# Altium footprint library Connectors.PcbLib: 135 footprints (part 3 of 9)
Each footprint in its own frame and in the unit in brackets; x right, y up, seen from the top. Pads: shape width x height; smd on the part's side, far side on the other; paste and mask are expansions set on the pad; w line width, h text height; cw(c..) or ccw(c..) is an arc to the next point about the centre after c.
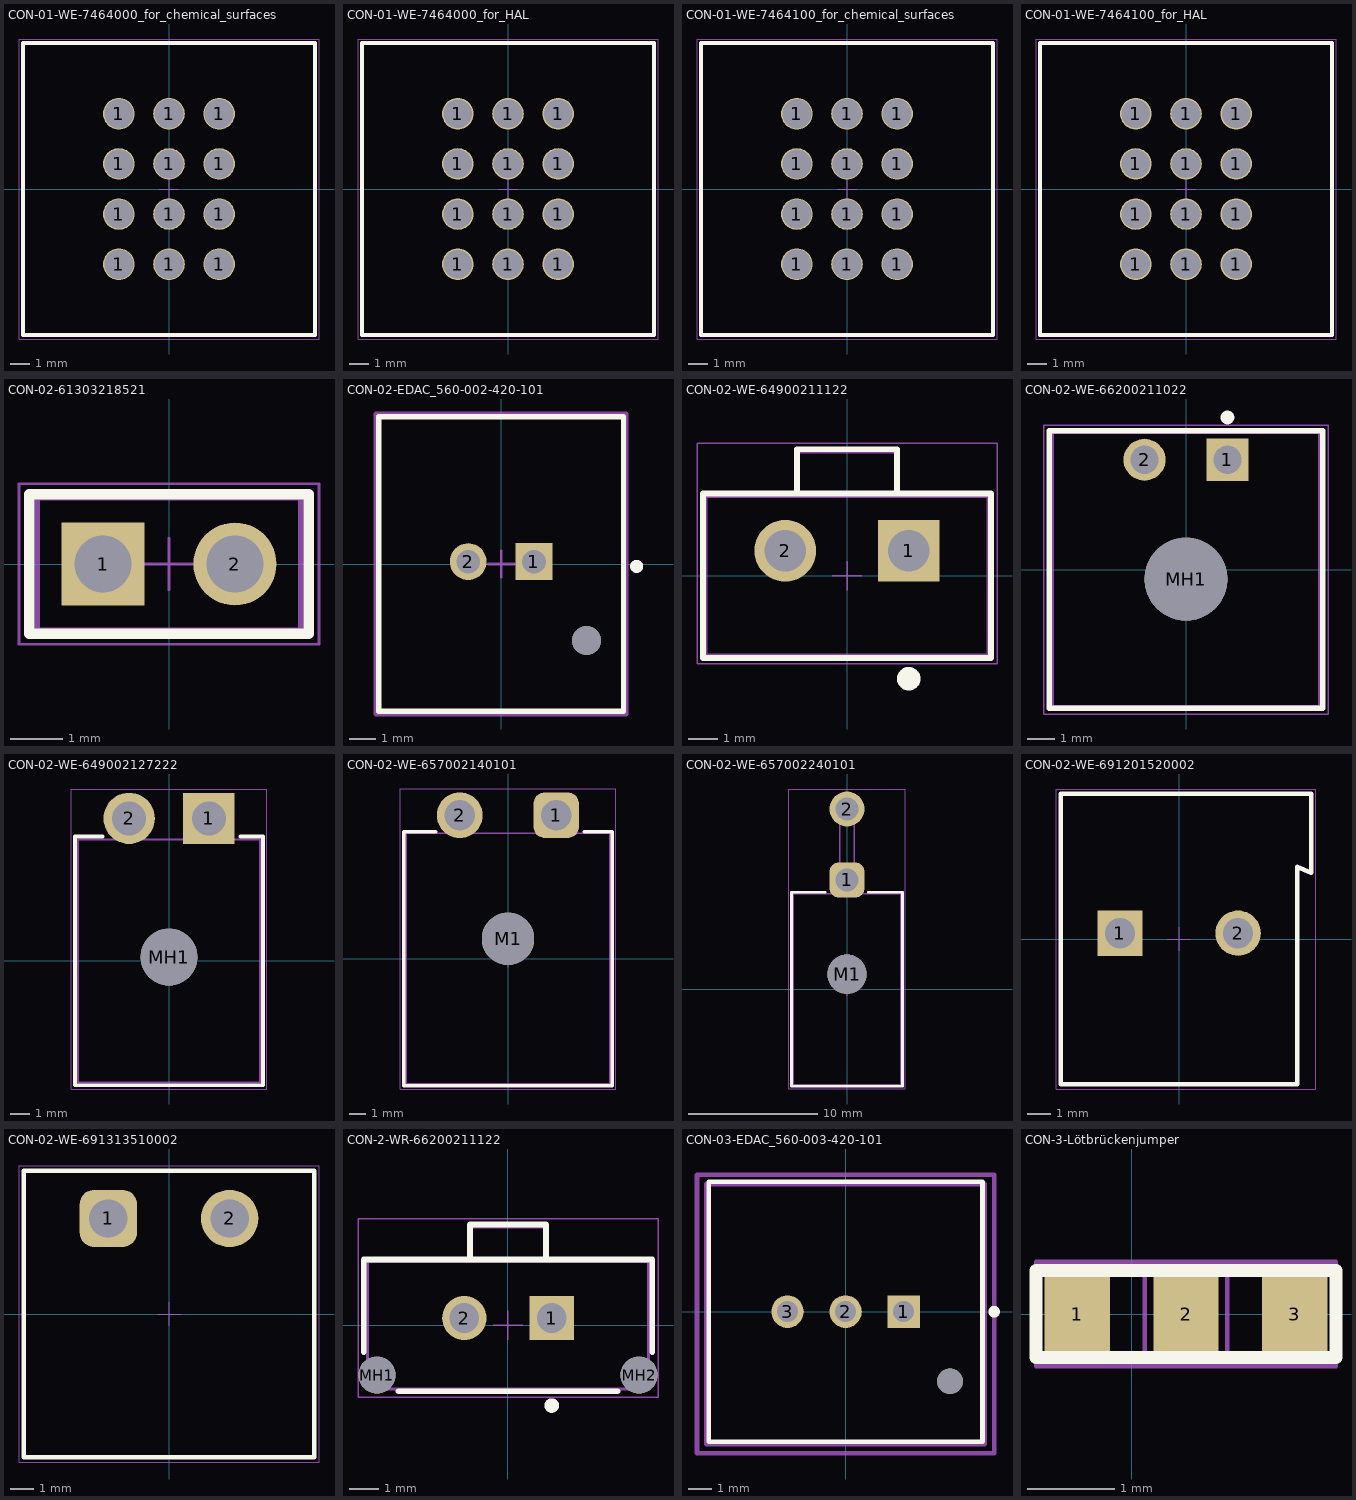
[diagram p2: the footprints below, top view; thin cyan lines are the x and y axes]

## CON-01-WE-7464000_for_chemical_surfaces [mm] "Direct Plug Terminal, 12pins"
height 18.1
pads (12):
  round 1.6 hole 1.475: 1(-2.54,-3.81) 1(-2.54,-1.27) 1(-2.54,1.27) 1(-2.54,3.81) 1(0,-3.81) 1(0,-1.27) 1(0,1.27) 1(0,3.81) 1(2.54,-3.81) 1(2.54,-1.27) 1(2.54,1.27) 1(2.54,3.81)
Top Overlay:
  lines w0.2: -7.4,-7.4 -7.4,7.4 7.4,7.4 7.4,-7.4 -7.4,-7.4
Top Component Center:
  lines w0.05: -0.5,0 0.5,0 ; 0,-0.5 0,0.5
Top Component Outline:
  lines w0.1: -7.4,-7.4 -7.4,7.4 7.4,7.4 7.4,-7.4 -7.4,-7.4
Top Courtyard (Mech26):
  lines w0.05: -7.6,-7.6 -7.6,7.6 7.6,7.6 7.6,-7.6 -7.6,-7.6
3D body "7464000 (rev1).stp": height 18.1, standoff -3.5, extent -7.385,-7.385 7.385,7.385

## CON-01-WE-7464000_for_HAL [mm] "Direct Plug Terminal, 12pins"
height 18.1
pads (12):
  round 1.6 hole 1.45: 1(-2.54,-3.81) 1(-2.54,-1.27) 1(-2.54,1.27) 1(-2.54,3.81) 1(0,-3.81) 1(0,-1.27) 1(0,1.27) 1(0,3.81) 1(2.54,-3.81) 1(2.54,-1.27) 1(2.54,1.27) 1(2.54,3.81)
Top Overlay:
  lines w0.2: -7.4,-7.4 -7.4,7.4 7.4,7.4 7.4,-7.4 -7.4,-7.4
Top Component Center:
  lines w0.05: -0.5,0 0.5,0 ; 0,-0.5 0,0.5
Top Component Outline:
  lines w0.1: -7.4,-7.4 -7.4,7.4 7.4,7.4 7.4,-7.4 -7.4,-7.4
Top Courtyard (Mech26):
  lines w0.05: -7.6,-7.6 -7.6,7.6 7.6,7.6 7.6,-7.6 -7.6,-7.6
3D body "7464000 (rev1).stp": height 18.1, standoff -3.5, extent -7.385,-7.385 7.385,7.385

## CON-01-WE-7464100_for_chemical_surfaces [mm] "Direct Plug Terminal, 12pins"
height 18.1
pads (12):
  round 1.6 hole 1.475: 1(-2.54,-3.81) 1(-2.54,-1.27) 1(-2.54,1.27) 1(-2.54,3.81) 1(0,-3.81) 1(0,-1.27) 1(0,1.27) 1(0,3.81) 1(2.54,-3.81) 1(2.54,-1.27) 1(2.54,1.27) 1(2.54,3.81)
Top Overlay:
  lines w0.2: -7.4,-7.4 7.4,-7.4 7.4,7.4 -7.4,7.4 -7.4,-7.4
Top Component Center:
  lines w0.05: -0.5,0 0.5,0 ; 0,-0.5 0,0.5
Top Component Outline:
  lines w0.1: -7.4,-7.4 7.4,-7.4 7.4,7.4 -7.4,7.4 -7.4,-7.4
Top Courtyard (Mech26):
  lines w0.05: -7.6,-7.6 7.6,-7.6 7.6,7.6 -7.6,7.6 -7.6,-7.6
3D body "7464000 (rev1).stp": height 18.1, standoff -3.5, extent -7.385,-7.385 7.385,7.385

## CON-01-WE-7464100_for_HAL [mm] "Direct Plug Terminal, 12pins"
height 18.1
pads (12):
  round 1.6 hole 1.45: 1(-2.54,-3.81) 1(-2.54,-1.27) 1(-2.54,1.27) 1(-2.54,3.81) 1(0,-3.81) 1(0,-1.27) 1(0,1.27) 1(0,3.81) 1(2.54,-3.81) 1(2.54,-1.27) 1(2.54,1.27) 1(2.54,3.81)
Top Overlay:
  lines w0.2: -7.4,-7.4 7.4,-7.4 7.4,7.4 -7.4,7.4 -7.4,-7.4
Top Component Center:
  lines w0.05: -0.5,0 0.5,0 ; 0,-0.5 0,0.5
Top Component Outline:
  lines w0.1: -7.4,-7.4 7.4,-7.4 7.4,7.4 -7.4,7.4 -7.4,-7.4
Top Courtyard (Mech26):
  lines w0.05: -7.6,-7.6 -7.6,7.6 7.6,7.6 7.6,-7.6 -7.6,-7.6
3D body "7464000 (rev1).stp": height 18.1, standoff -3.5, extent -7.385,-7.385 7.385,7.385

## CON-02-61303218521 [mm] "Pin Header, pitch 2.54 mm, THT, Vertical, single row, 2p"
height 36.48
pads (2):
  rect 1.6x1.6 hole 1.1: 1(-1.27,0)
  round 1.6 hole 1.1: 2(1.27,0)
Top Overlay:
  lines w0.2: -2.69,-1.345 2.69,-1.345 2.69,1.345 -2.69,1.345 -2.69,-1.345
Top Component Center:
  lines w0.05: -0.5,0 0.5,0 ; 0,-0.5 0,0.5
Top Component Outline:
  lines w0.1: -2.54,-1.27 2.54,-1.27 2.54,1.27 -2.54,1.27 -2.54,-1.27
Top Courtyard (Mech26):
  lines w0.05: -2.89,-1.545 2.89,-1.545 2.89,1.545 -2.89,1.545 -2.89,-1.545
3D body "61303218521_2pin_simple.stp": height 36.48, standoff -3, extent -2.54,-1.27 2.54,1.27

## CON-02-EDAC_560-002-420-101 [mm] "EDAC 560 SERIES WATERPROOF CONNECTOR 2 Pin"
height 15.5
pads (3):
  rect 1.4x1.4 hole 0.9 paste-2539.97 mask+0: 1(1.25,0.09)
  round 1.4 hole 0.9 paste-2539.97 mask+0: 2(-1.25,0.09)
  round 1.1 hole 1.1 unplated paste-2539.97 mask+0: ""(3.25,-2.91)
Top Overlay:
  circle w0.25: c5.15,-0.09 r0.125
  lines w0.2: -4.65,-5.6 4.65,-5.6 4.65,5.6 -4.65,5.6 -4.65,-5.6
Top Component Center:
  lines w0.1: -0.5,0 0.5,0 ; 0,-0.5 0,0.5
Top Component Outline:
  lines w0.15: -4.65,-5.6 -4.65,5.6 4.65,5.6 4.65,-5.6 -4.65,-5.6
Top Courtyard (Mech26):
  lines w0.2: -4.75,-5.7 -4.75,5.7 4.75,5.7 4.75,-5.7 -4.75,-5.7
Top Designator:
  text ".Designator" at 0,0 h1
3D body "Conn_EDAC_560-002-420-101_eec.STEP": height 15.5, standoff -3.55, extent -4.644,-5.597 4.656,5.553

## CON-02-WE-64900211122 [mm] "4.20mm Male Single Row Vertical Header, 2p"
height 12.8
pads (2):
  rect 2.1x2.1 hole 1.4: 1(2.1,0.85)
  round 2.1 hole 1.4: 2(-2.1,0.85)
Top Overlay:
  circle w0.4: c2.1,-3.5 r0.2
  lines w0.2: -1.7,2.8 -1.7,4.3 1.7,4.3 1.7,2.8 ; -4.9,-2.8 4.9,-2.8 4.9,2.8 -4.9,2.8 -4.9,-2.8
Top Component Center:
  lines w0.05: -0.5,0 0.5,0 ; 0,-0.5 0,0.5
Top Component Outline:
  lines w0.1: -1.7,2.7 -1.7,4.2 1.7,4.2 1.7,2.7 ; -4.8,-2.7 -4.8,2.7 4.8,2.7 4.8,-2.7 -4.8,-2.7
Top Courtyard (Mech26):
  lines w0.05: -5.1,-3 -5.1,4.5 5.1,4.5 5.1,-3 -5.1,-3
3D body "64900211122.stp": height 12.83, standoff -3.47, extent -4.8,-2.7 4.8,4.2

## CON-02-WE-66200211022 [mm] "3.00mm Male Single Row Angled Header with Plastic Pegs, 2p"
height 5.07
pads (3):
  rect 1.52x1.52 hole 1.02: 1(1.5,3.97)
  round 1.52 hole 1.02: 2(-1.5,3.97)
  round 3 hole 3 unplated: MH1(0,-0.35)
Top Overlay:
  circle w0.25: c1.5,5.5 r0.125
  lines w0.2: -4.95,-5.025 4.95,-5.025 4.95,5.025 -4.95,5.025 -4.95,-5.025
Top Component Center:
  lines w0.05: -0.5,0 0.5,0 ; 0,-0.5 0,0.5
Top Component Outline:
  lines w0.1: -4.825,-4.95 4.825,-4.95 4.825,4.95 -4.825,4.95 -4.825,-4.95
Top Courtyard (Mech26):
  lines w0.05: -5.15,-5.225 5.15,-5.225 5.15,5.225 -5.15,5.225 -5.15,-5.225
3D body "66200211022.stp": height 5.6, standoff -3.16, extent -4.825,-4.95 4.825,4.95

## CON-02-WE-649002127222 [mm] "4.20mm Male Single Row Angled Header with Mounting Pegs, 2p"
height 5.8
pads (3):
  rect 2.7x2.7 hole 1.8: 1(2.1,7.5)
  round 2.7 hole 1.8: 2(-2.1,7.5)
  round 3 hole 3 unplated: MH1(0,0.2)
Top Overlay:
  lines w0.2: -3.5,6.55 -4.95,6.55 -4.95,-6.55 4.95,-6.55 4.95,6.55 3.75,6.55
Top Component Center:
  lines w0.05: -0.5,0 0.5,0 ; 0,-0.5 0,0.5
Top Component Outline:
  lines w0.1: -4.8,-6.4 -4.8,6.4 4.8,6.4 4.8,-6.4 -4.8,-6.4
Top Courtyard (Mech26):
  lines w0.05: -5.15,-6.75 5.15,-6.75 5.15,9.05 -5.15,9.05 -5.15,-6.75
3D body "649002127222.stp": height 7.23, standoff -3.47, extent -4.8,-6.4 4.8,8.05

## CON-02-WE-657002140101 [mm] "WR-MPC5 THT Single Row Male Header Right Angled, 02p"
height 7.25
pads (3):
  rrect50% 2.7x2.7 hole 1.8: 1(2.85,8.47)
  round 2.7 hole 1.8: 2(-2.85,8.47)
  round 3.1 hole 3.1 unplated: M1(0,1.17)
Top Overlay:
  lines w0.2: -4.25,7.5 -6.15,7.5 -6.15,-7.5 6.15,-7.5 6.15,7.5 4.5,7.5
Top Component Center:
  lines w0.05: -0.5,0 0.5,0 ; 0,-0.5 0,0.5
Top Component Outline:
  lines w0.1: -3.42,7.4 -3.42,9.04 -2.28,9.04 -2.28,7.4 ; 2.28,7.4 2.28,9.04 3.42,9.04 3.42,7.4 ; -6.025,-7.4 -6.025,7.4 6.025,7.4 6.025,-7.4 -6.025,-7.4
Top Courtyard (Mech26):
  lines w0.05: -6.35,-7.7 6.35,-7.7 6.35,10.02 -6.35,10.02 -6.35,-7.7
Top Designator:
  text ".Designator" at -7.498,-0.5 h1.5
3D body "657002140101.stp": height 8.85, standoff -3.43, extent -6.025,-7.4 6.025,9.04

## CON-02-WE-657002240101 [mm] "WR-MPC5 Dual Row Male Header Right Angled, GW, THT, 02p"
height 14.53
pads (3):
  rrect50% 2.7x2.7 hole 1.8: 1(0,8.47)
  round 2.7 hole 1.8: 2(0,13.97)
  round 3.05 hole 3.05 unplated: M1(0,1.17)
Top Overlay:
  lines w0.2: -1.675,7.525 -4.3,7.525 -4.3,-7.525 4.3,-7.525 4.3,7.525 1.65,7.525
Top Component Center:
  lines w0.05: -0.5,0 0.5,0 ; 0,-0.5 0,0.5
Top Component Outline:
  lines w0.1: -0.57,7.4 -0.57,14.54 0.57,14.54 0.57,7.4 ; -0.57,9.04 0.57,9.04 ; -4.175,-7.4 -4.175,7.4 4.175,7.4 4.175,-7.4 -4.175,-7.4
Top Courtyard (Mech26):
  lines w0.05: -4.5,-7.725 4.5,-7.725 4.5,15.52 -4.5,15.52 -4.5,-7.725
Top Designator:
  text ".Designator" at -7.498,-0.5 h1.5
3D body "657002240101.stp": height 14.69, standoff -3.44, extent -4.175,-7.38 4.175,14.56

## CON-02-WE-691201520002 [mm] "Serie 2015 - 5.08 mm _ 2 pins"
height 12
pads (2):
  rect 1.95x1.95 hole 1.3: 1(-2.54,0.25)
  round 1.95 hole 1.3: 2(2.54,0.25)
Top Overlay:
  lines w0.2: -5.08,-6.25 -5.08,6.25 5.68,6.25 5.68,2.85 5.08,3.1 5.08,-6.25 -5.08,-6.25
Top Component Center:
  lines w0.05: -0.5,0 0.5,0 ; 0,-0.5 0,0.5
Top Component Outline:
  lines w0.1: -5.08,-6.25 5.08,-6.25 5.08,3.1 5.68,2.85 5.68,6.25 -5.08,6.25 -5.08,-6.25
Top Courtyard (Mech26):
  lines w0.05: -5.28,-6.45 -5.28,6.45 5.88,6.45 5.88,-6.45 -5.28,-6.45
3D body "691201520002.stp": height 12.1, standoff -4.4, extent -5.08,-6.25 5.68,6.25

## CON-02-WE-691313510002 [mm] "5,08mm - PCB Headers - Horizontal - Closed ends - 02p"
height 8.5
pads (2):
  rrect50% 2.4x2.4 hole 1.6: 1(-2.54,4)
  round 2.4 hole 1.6: 2(2.54,4)
Top Overlay:
  lines w0.2: -6.08,-6 -6.08,6 6.08,6 6.08,-6 -6.08,-6
Top Component Center:
  lines w0.05: -0.5,0 0.5,0 ; 0,-0.5 0,0.5
Top Component Outline:
  lines w0.1: -6.08,-6 -6.08,6 6.08,6 6.08,-6 -6.08,-6
Top Courtyard (Mech26):
  lines w0.05: -6.28,-6.2 6.28,-6.2 6.28,6.2 -6.28,6.2 -6.28,-6.2
Top Designator:
  text ".Designator" at -7.498,-0.5 h1.5
3D body "691313510002.stp": height 8.55, standoff -3.45, extent -6.08,-6 6.08,6

## CON-2-WR-66200211122 [mm] "3.00mm Male Single Row Vertical Header, 2p"
height 11
pads (4):
  rect 1.52x1.52 hole 1.02: 1(1.5,0.255)
  round 1.52 hole 1.02: 2(-1.5,0.255)
  round 1.27 hole 1.27 unplated: MH1(-4.5,-1.705) MH2(4.5,-1.705)
Top Overlay:
  circle w0.25: c1.5,-2.75 r0.125
  lines w0.2: -4.95,-0.91 -4.95,2.26 4.95,2.26 4.95,-0.91 ; -3.755,-2.26 3.755,-2.26 ; -1.3,2.26 -1.3,3.46 1.3,3.46 1.3,2.26
Top Component Center:
  lines w0.05: -0.5,0 0.5,0 ; 0,-0.5 0,0.5
Top Component Outline:
  lines w0.1: -1.3,2.185 -1.3,3.385 1.3,3.385 1.3,2.185 ; 4.825,-2.185 4.825,2.185 -4.825,2.185 -4.825,-2.185 4.83,-2.185
Top Courtyard (Mech26):
  lines w0.05: -5.15,-2.46 5.15,-2.46 5.15,3.66 -5.15,3.66 -5.15,-2.46
3D body "66200211122.stp": height 9.93, standoff -3.15, extent -4.825,-2.185 4.825,3.385

## CON-03-EDAC_560-003-420-101 [mm] "EDAC 560 SERIES WATERPROOF CONNECTOR 3 Pin"
height 15.5
pads (4):
  rect 1.4x1.4 hole 0.9 paste-2539.97 mask+0: 1(2.5,0)
  round 1.4 hole 0.9 paste-2539.97 mask+0: 2(0,0) 3(-2.5,0)
  round 1.1 hole 1.1 unplated paste-2539.97 mask+0: ""(4.5,-3)
Top Overlay:
  circle w0.25: c6.4,0 r0.125
  lines w0.2: -5.9,-5.6 -5.9,5.6 5.9,5.6 5.9,-5.6 -5.9,-5.6
Top Component Center:
  lines w0.1: -0.5,0 0.5,0 ; 0,-0.5 0,0.5
Top Component Outline:
  lines w0.2: -6,-5.7 6,-5.7 6,5.5 -6,5.5 -6,-5.7
Top Courtyard (Mech26):
  lines w0.2: -6.4,-6.1 6.4,-6.1 6.4,5.9 -6.4,5.9 -6.4,-6.1
3D body "560-003-420-101 - EDAC E-SEAL Waterproof Connector.STEP": height 15.5, standoff -3.4, extent -5.9,-5.7 5.9,5.45

## CON-3-Lötbrückenjumper [mm] "3 Pads 0603"
pads (3):
  rect 0.75x0.85 smd: 1(-0.625,0) 2(0.625,0) 3(1.875,0)
Top Overlay:
  lines w0.15: 0.15,-0.5 2.35,-0.5 2.35,0.5 0.15,0.5 ; 1.1,-0.5 -1.1,-0.5 -1.1,0.5 1.1,0.5
Top Component Center:
  lines w0.1: 0.325,0 0.925,0 ; 0.625,-0.3 0.625,0.3
Top Component Outline:
  lines w0.1: -0.85,-0.475 0.85,-0.475 0.85,0.475 -0.85,0.475 -0.85,-0.475 ; 0.4,-0.475 2.1,-0.475 2.1,0.475 0.4,0.475 0.4,-0.475
Top Courtyard (Mech26):
  lines w0.05: -1.1,-0.6 -1.1,0.6 1.1,0.6 1.1,-0.6 -1.1,-0.6 ; 0.15,-0.6 2.35,-0.6 2.35,0.6 0.15,0.6 0.15,-0.6